# Altium footprint library ComplexCurcuit.PcbLib: 36 footprints (part 1 of 3)
Each footprint in its own frame and in the unit in brackets; x right, y up, seen from the top. Pads: shape width x height; smd on the part's side, far side on the other; paste and mask are expansions set on the pad; w line width, h text height; cw(c..) or ccw(c..) is an arc to the next point about the centre after c.
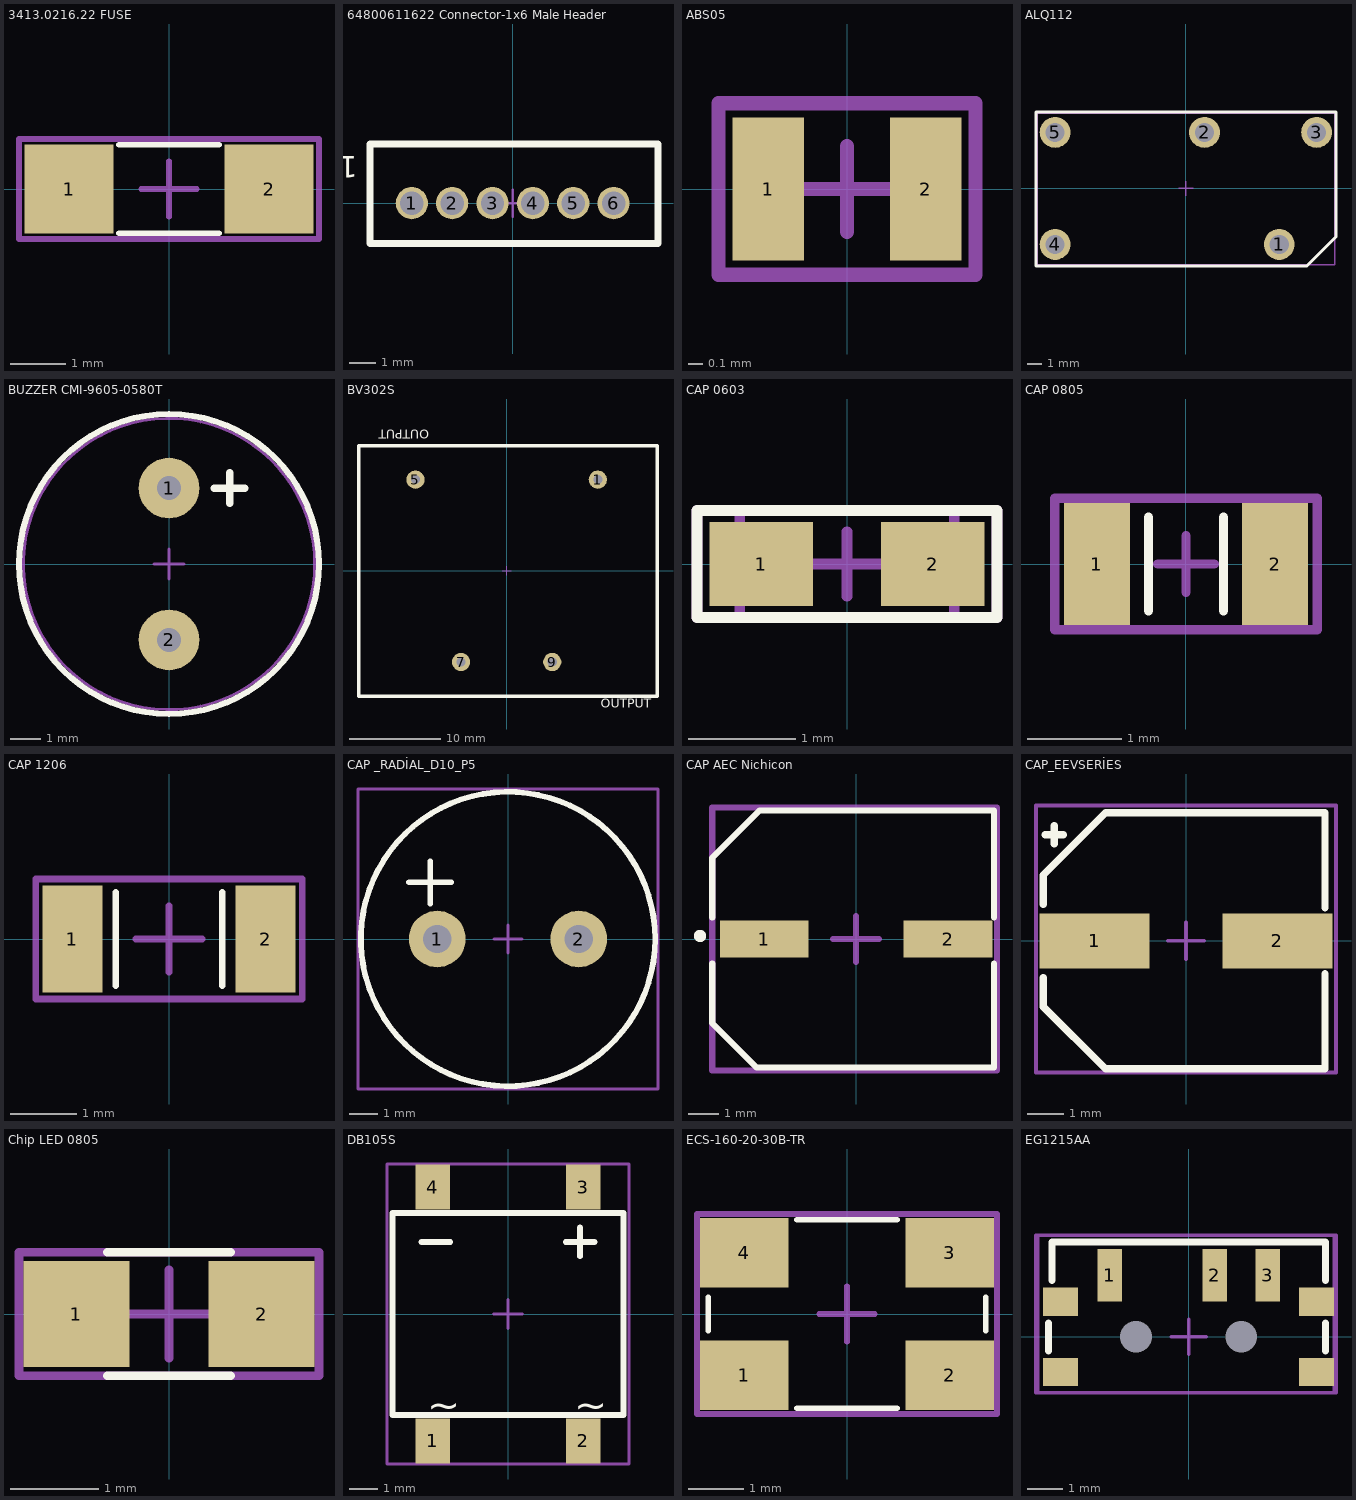
[diagram p0: the footprints below, top view; thin cyan lines are the x and y axes]

## 3413.0216.22 FUSE [mm]
pads (2):
  rect 1.6x1.6 smd mask+0.05: 1(-1.8,0) 2(1.8,0)
Top Overlay:
  lines w0.1: -0.9,-0.8 0.9,-0.8 ; -0.9,0.8 0.9,0.8
Top Component Center:
  lines w0.1: -0.5,0 0.5,0 ; 0,-0.5 0,0.5 ; -2.7,-0.9 -2.7,0.9 2.7,0.9 2.7,-0.9 -2.7,-0.9
Top Designator:
  lines w0.1: -2.7,-0.9 2.7,-0.9 2.7,0.9 -2.7,0.9 -2.7,-0.9
  text ".Designator" at -2.1,-0.367 h1
3D body "FUS1206_24N_SCH.step": height 0.61, standoff 0, extent -1.7,-0.8 1.5,0.8

## 64800611622 Connector-1x6 Male Header [mm]
pads (6):
  round 1.2 hole 0.87 mask+0.05: 1(-3.75,0) 2(-2.25,0) 3(-0.75,0) 4(0.75,0) 5(2.25,0) 6(3.75,0)
Top Overlay:
  lines w0.25: -5.3,-1.5 -5.3,2.2 5.4,2.2 5.4,-1.5 -5.3,-1.5
  text "1" at -5.75,1.75 h0.8
Top Component Center:
  lines w0.1: -0.5,0 0.5,0 ; 0,-0.5 0,0.5 ; -5.3,-1.5 -5.3,2.2 5.4,2.2 5.4,-1.5 -5.3,-1.5
Top Designator:
  lines w0.1: -5.3,-1.5 5.4,-1.5 5.4,2.2 -5.3,2.2 -5.3,-1.5
  text ".Designator" at -3.19,0.877 h0.5
3D body "64800611622 (rev1).stp": height 5.25, standoff -1.95, extent -5.25,-1.4 5.25,2.1

## ABS05 [mm]
pads (2):
  rect 0.5x1 smd mask+0.05: 1(-0.55,0) 2(0.55,0)
Top Component Center:
  lines w0.1: -0.3,0 0.3,0 ; 0,-0.3 0,0.3 ; -0.9,-0.6 -0.9,0.6 0.9,0.6 0.9,-0.6 -0.9,-0.6
Top Designator:
  lines w0.1: -0.9,-0.6 0.9,-0.6 0.9,0.6 -0.9,0.6 -0.9,-0.6
  text ".Designator" at -0.65,-0.15 h0.3
3D body "ABS05-32.768KHZ-T--3DModel-STEP-400430.STEP": height 0.55, standoff 0.05, extent -0.8,-0.5 0.8,0.5

## ALQ112 [mm] "RELAY"
pads (5):
  round 2.1 hole 1.3 mask+0.05: 1(6.35,-3.81) 2(1.27,3.81) 3(8.89,3.81) 4(-8.89,-3.81) 5(-8.89,3.81)
Top Overlay:
  lines w0.2: -10.19,-5.29 -10.19,5.21 10.21,5.21 10.21,-3.29 8.21,-5.29 -10.19,-5.29
Top Component Center:
  lines w0.1: -0.499,-0.006 0.501,-0.006 ; 0,-0.5 0,0.5 ; -10.09,-5.19 -10.09,5.11 10.11,5.11 10.11,-5.19 -10.09,-5.19
Top Designator:
  lines w0.1: -10.09,-5.19 -10.09,5.11 10.11,5.11 10.11,-5.19 -10.09,-5.19
  text ".Designator" at -3.49,0.043 h1
3D body: height 0.2, standoff -4, extent 0.87,3.66 1.67,3.96
3D body: height 15.6, standoff 0.4, extent -10,-4.98 10,5.02
3D body: height 15.6, standoff 0.4, extent 8.11,-4.19 9.11,-3.19
3D body: height 0.45, standoff -3.75, extent -9.29,3.41 -8.49,4.21
3D body: height 0.45, standoff -3.75, extent -9.29,-4.21 -8.49,-3.41
3D body: height 0.2, standoff -4, extent 8.51,3.66 9.31,3.96
3D body: height 0.2, standoff -4, extent 5.95,-3.96 6.75,-3.66

## BUZZER CMI-9605-0580T [mm] "CMI-9605-0580T-80dB"
pads (2):
  round 2 hole 0.8 mask+0.05: 1(0,2.5) 2(0,-2.5)
Top Overlay:
  circle w0.2: c0,0 r4.941
  lines w0.25: 1.5,2.5 2.5,2.5 ; 2,2 2,3
Top Component Center:
  circle w0.1: c0,0 r4.8
  lines w0.1: -0.5,0 0.5,0 ; 0,-0.5 0,0.5
Top Designator:
  circle w0.1: c0,0 r4.8
  text ".Designator" at -2,-0.367 h1
3D body: height 5.2, standoff 5.15, extent -4,-4 4,4
3D body: height 1.55, standoff -3.95, extent -0.3,-2.8 0.3,-2.2
3D body: height 0, standoff -5.5, extent -0.3,2.2 0.3,2.8
3D body: height 5.1, standoff 0.1, extent -4.8,-4.8 4.8,4.8

## BV302S [mm]
pads (4):
  round 2 hole 1 mask+0.05: 1(10,10) 5(-10,10) 7(-5,-10) 9(5,-10)
Top Overlay:
  lines w0.4: -16.2,-13.743 -16.2,13.7 16.5,13.7 16.5,-13.743 -16.2,-13.743
  text "OUTPUT" at 10.3,-15 h1
  text "OUTPUT" at -8.5,15.5 h1
Top Component Center:
  lines w0.1: -0.5,0 0.5,0 ; 0,-0.5 0,0.5 ; -16.3,-13.7 -16.3,13.7 16.5,13.7 16.5,-13.7 -16.3,-13.7
Top Designator:
  lines w0.1: -16.2,-13.7 16.6,-13.7 16.6,13.7 -16.2,13.7 -16.2,-13.7
  text ".Designator" at -8.2,-0.8 h1.5
3D body "User Library-Hahn BV EI 302 2902.step": height 21.8, standoff -4.5, extent -16.15,-13.85 16.35,13.65

## CAP 0603 [mil] "0603 Pack"
pads (2):
  rect 38x31 smd mask+1.97: 1(-31.5,0) 2(31.5,0)
Top Overlay:
  lines w3.94: -55.12,-19.68 55.12,-19.68 55.12,19.68 -55.12,19.68 -55.12,-19.68
Top 3D Body:
  lines w3.94: -39.37,-19.68 -39.37,19.68 39.37,19.68 39.37,-19.68 -39.37,-19.68
Top Component Center:
  lines w3.94: -11.81,0 11.81,0 ; 0,-11.81 0,11.81 ; -55.12,-19.68 -55.12,19.68 55.12,19.68 55.12,-19.68 -55.12,-19.68
Top Designator:
  lines w3.94: -55.12,-19.68 -55.12,19.68 55.12,19.68 55.12,-19.68 -55.12,-19.68
  text ".Designator" at -31.5,-5.25 h19.68
3D body "CAPC0603.STEP": height 31.5, standoff 0, extent -41.35,-19.68 41.35,20.82

## CAP 0805 [mm]
pads (2):
  rect 0.7x1.3 smd mask+0.05: 1(-0.95,0) 2(0.95,0)
Top Overlay:
  lines w0.1: -0.4,-0.5 -0.4,0.5 ; 0.4,-0.5 0.4,-0.25 0.4,0.25 0.4,0.5
Top Component Center:
  lines w0.1: -0.3,0 0.3,0 ; 0,-0.3 0,0.3 ; -1.4,-0.7 -1.4,0.7 1.4,0.7 1.4,-0.7 -1.4,-0.7
Top Designator:
  lines w0.1: -1.4,-0.7 1.4,-0.7 1.4,0.7 -1.4,0.7 -1.4,-0.7
  text ".Designator" at -0.8,-0.133 h0.5
3D body "?_0805.STEP": height 1.36, standoff 0.01, extent -1,-0.6 1,0.6

## CAP 1206 [mm]
pads (2):
  rect 0.9x1.6 smd mask+0.05: 1(-1.45,0) 2(1.45,0)
Top Overlay:
  lines w0.1: -0.8,-0.7 -0.8,0.7 ; 0.8,-0.7 0.8,0.7
Top Component Center:
  lines w0.1: -0.5,0 0.5,0 ; 0,-0.5 0,0.5 ; -2,-0.9 -2,0.9 2,0.9 2,-0.9 -2,-0.9
Top Designator:
  lines w0.1: -2,-0.9 2,-0.9 2,0.9 -2,0.9 -2,-0.9
  text ".Designator" at -0.61,-0.377 h0.4
3D body "C1206C.STEP": height 0.95, standoff 0, extent -1.6,-0.8 1.6,0.8

## CAP _RADİAL_D10_P5 [mm] "ESH477M050AH4AA"
pads (2):
  round 2 hole 1 mask+0.05: 1(-2.5,0) 2(2.5,0)
Top Overlay:
  circle w0.2: c0,0 r5.2
  lines w0.2: -3.5,2 -2,2 ; -2.75,1.25 -2.75,2.75
Top Component Center:
  lines w0.1: -0.5,0 0.5,0 ; 0,-0.5 0,0.5 ; -5.3,-5.3 -5.3,5.3 5.3,5.3 5.3,-5.3 -5.3,-5.3
Top Designator:
  lines w0.1: -5.3,-5.3 5.3,-5.3 5.3,5.3 -5.3,5.3 -5.3,-5.3
  text ".Designator" at -3,-2.067 h1
3D body "CAP_ESH_H4_KEM.step": height 22.51, standoff -3.87, extent -5.269,-5.242 5.245,5.242

## CAP AEC Nichicon [mm] "UWT1H101MNL1GS"
pads (2):
  rect 2.9x1.2 smd mask+0.05: 1(-3,0) 2(3,0)
Top Overlay:
  circle w0.2: c-5.1,0.1 r0.1
  lines w0.2: -4.7,-0.8 -4.7,-1.85 -4.7,-2.75 -3.25,-4.2 4.5,-4.2 4.5,-0.8 ; -4.7,0.7 -4.7,1.437 -4.7,2.112 -4.7,2.65 -3.15,4.2 4.5,4.2 4.5,0.7
Top Component Center:
  lines w0.2: -0.75,0 0.75,0 ; 0,-0.75 0,0.75 ; -4.7,-4.3 4.6,-4.3 4.6,4.3 -4.7,4.3 -4.7,-4.3
Top Designator:
  lines w0.2: -4.7,-4.3 4.6,-4.3 4.6,4.3 -4.7,4.3 -4.7,-4.3
  text ".Designator" at -2.6,-1.567 h1
3D body "PCAP_8x10-ELECT_NCA.step": height 10.44, standoff 0.1, extent -4.648,-4.254 4.648,4.254

## CAP_EEVSERİES [mm]
pads (2):
  rect 3x1.5 smd mask+0.05: 1(-2.5,0) 2(2.5,0)
Top Overlay:
  lines w0.2: -3.9,-1 -3.9,-1.8 -2.2,-3.5 3.8,-3.5 3.8,-0.9 ; -3.9,1 -3.9,1.8 -2.2,3.5 3.8,3.5 3.8,0.9 ; -3.85,2.9 -3.35,2.9 ; -3.6,2.65 -3.6,3.15
Top Component Center:
  lines w0.1: -0.5,0 0.5,0 ; 0,-0.5 0,0.5 ; -4.1,-3.6 4.1,-3.6 4.1,3.7 -4.1,3.7 -4.1,1.8 -4.1,-3.6
Top Designator:
  lines w0.1: -4.1,-3.6 -4.1,1.8 -4.1,3.7 4.1,3.7 4.1,-3.6 -4.1,-3.6
  text ".Designator" at -2.1,-1.333 h0.8
3D body "EEV686M035A9HAA.step": height 8.06, standoff 0.05, extent -3.8,-3.4 3.8,3.4

## Chip LED 0805 [mm]
pads (2):
  rect 1.2x1.2 smd mask+0.05: 1(-1.05,0) 2(1.05,0)
Top Overlay:
  lines w0.1: -0.7,-0.7 0.7,-0.7 ; -0.7,0.7 0.7,0.7
Top Component Center:
  lines w0.1: -0.5,0 0.5,0 ; 0,-0.5 0,0.5 ; -1.7,-0.7 -1.7,0.7 1.7,0.7 1.7,-0.7 -1.7,-0.7
Top Designator:
  lines w0.1: -1.7,-0.7 1.7,-0.7 1.7,0.7 -1.7,0.7 -1.7,-0.7
  text ".Designator" at -1.2,-0.233 h0.5
3D body "Diode_OSRAM_LH_R974-LP-1_eec.STEP": height 1, standoff 0.1, extent -1,-0.65 1,0.65

## DB105S [mm] "Diodes  Bridge Rectifier"
pads (4):
  rect 1.2x1.55 smd mask+0.05: 1(-2.605,-4.4) 2(2.605,-4.4) 3(2.605,4.4) 4(-2.605,4.4)
Top Overlay:
  lines w0.2: -3,2.5 -2,2.5 ; 2,2.5 3,2.5 ; 2.5,2 2.5,3 ; -4,-3.5 4,-3.5 4,3.5 -4,3.5 -4,-3.5
  text "~" at -2.8,-3.633 h1
  text "~" at 2.3,-3.633 h1
Top Component Center:
  lines w0.1: -0.498,-0.007 0.502,-0.007 ; 0,-0.5 0,0.5 ; -4.2,-5.2 4.2,-5.2 4.2,5.2 -4.2,5.2 -4.2,-5.2
Top Designator:
  lines w0.1: -4.2,-5.2 -4.2,5.2 4.2,5.2 4.2,-5.2 -4.2,-5.2
  text ".Designator" at -2.6,-0.367 h1
3D body "User Library-DB107S  DB-S.step": height 2.76, standoff 0.1, extent -4.16,-5.2 4.16,5.2

## ECS-160-20-30B-TR [mm] "16 MHz ±30ppm Crystal 20pF 50 Ohms 4-SMD, No Lead"
pads (4):
  rect 1.6x1.25 smd mask+0.05: 1(-1.85,-1.1) 2(1.85,-1.1) 3(1.85,1.1) 4(-1.85,1.1)
Top Overlay:
  lines w0.1: -2.5,-0.3 -2.5,0.3 ; -0.9,-1.7 0.9,-1.7 ; -0.9,1.7 0.9,1.7 ; 2.5,-0.3 2.5,0.3
Top Component Center:
  lines w0.1: -0.5,0 0.5,0 ; 0,-0.5 0,0.5 ; -2.7,-1.8 2.7,-1.8 2.7,1.8 -2.7,1.8 -2.7,-1.8
Top Designator:
  lines w0.1: -2.7,-1.8 2.7,-1.8 2.7,1.8 -2.7,1.8 -2.7,-1.8
  text ".Designator" at -1.7,-0.033 h0.8
3D body "ECS-160-20-30B-TR.STEP": height 0.95, standoff 0.1, extent -2.5,-1.6 2.5,1.6

## EG1215AA [mm] "Slide Switch"
pads (9):
  round 0 hole 0.9 mask+0.05: 0(-1.5,0) 0(1.5,0)
  rect 0.7x1.5 smd mask+0.05: 1(-2.25,1.75) 2(0.75,1.75) 3(2.25,1.75)
  rect 1x0.8 smd mask+0.05: ""(-3.65,-1) ""(-3.65,1) ""(3.65,-1) ""(3.65,1)
Top Overlay:
  lines w0.2: -4,-0.4 -4,0.4 ; -3.9,1.6 -3.9,2.7 3.9,2.7 3.9,1.6 ; 3.9,-0.4 3.9,0.4
Top Component Center:
  lines w0.1: -0.5,0 0.5,0 ; 0,-0.5 0,0.5 ; -4.3,-1.6 -4.3,-0.475 -4.3,0.088 -4.3,1.212 -4.3,1.775 -4.3,2.9 -2.175,2.9 2.075,2.9 4.2,2.9 4.2,1.575 4.2,-0.275 4.2,-1.6 -4.3,-1.6
Top Designator:
  lines w0.1: -4.35,-1.6 4.15,-1.6 4.15,-0.275 4.15,1.575 4.15,2.9 2.025,2.9 -2.225,2.9 -4.35,2.9 -4.35,1.775 -4.35,1.212 -4.35,0.088 -4.35,-0.475 -4.35,-1.6
  text ".Designator" at -2.2,-0.033 h0.5
3D body "EG1215AA--3DModel-STEP-1.STEP": height 1.4, standoff -0.3, extent -3.85,-2.7 3.85,2.2